# Altium footprint library My Footprint.PcbLib: 268 footprints (part 3 of 17)
Each footprint in its own frame and in the unit in brackets; x right, y up, seen from the top. Pads: shape width x height; smd on the part's side, far side on the other; paste and mask are expansions set on the pad; w line width, h text height; cw(c..) or ccw(c..) is an arc to the next point about the centre after c.
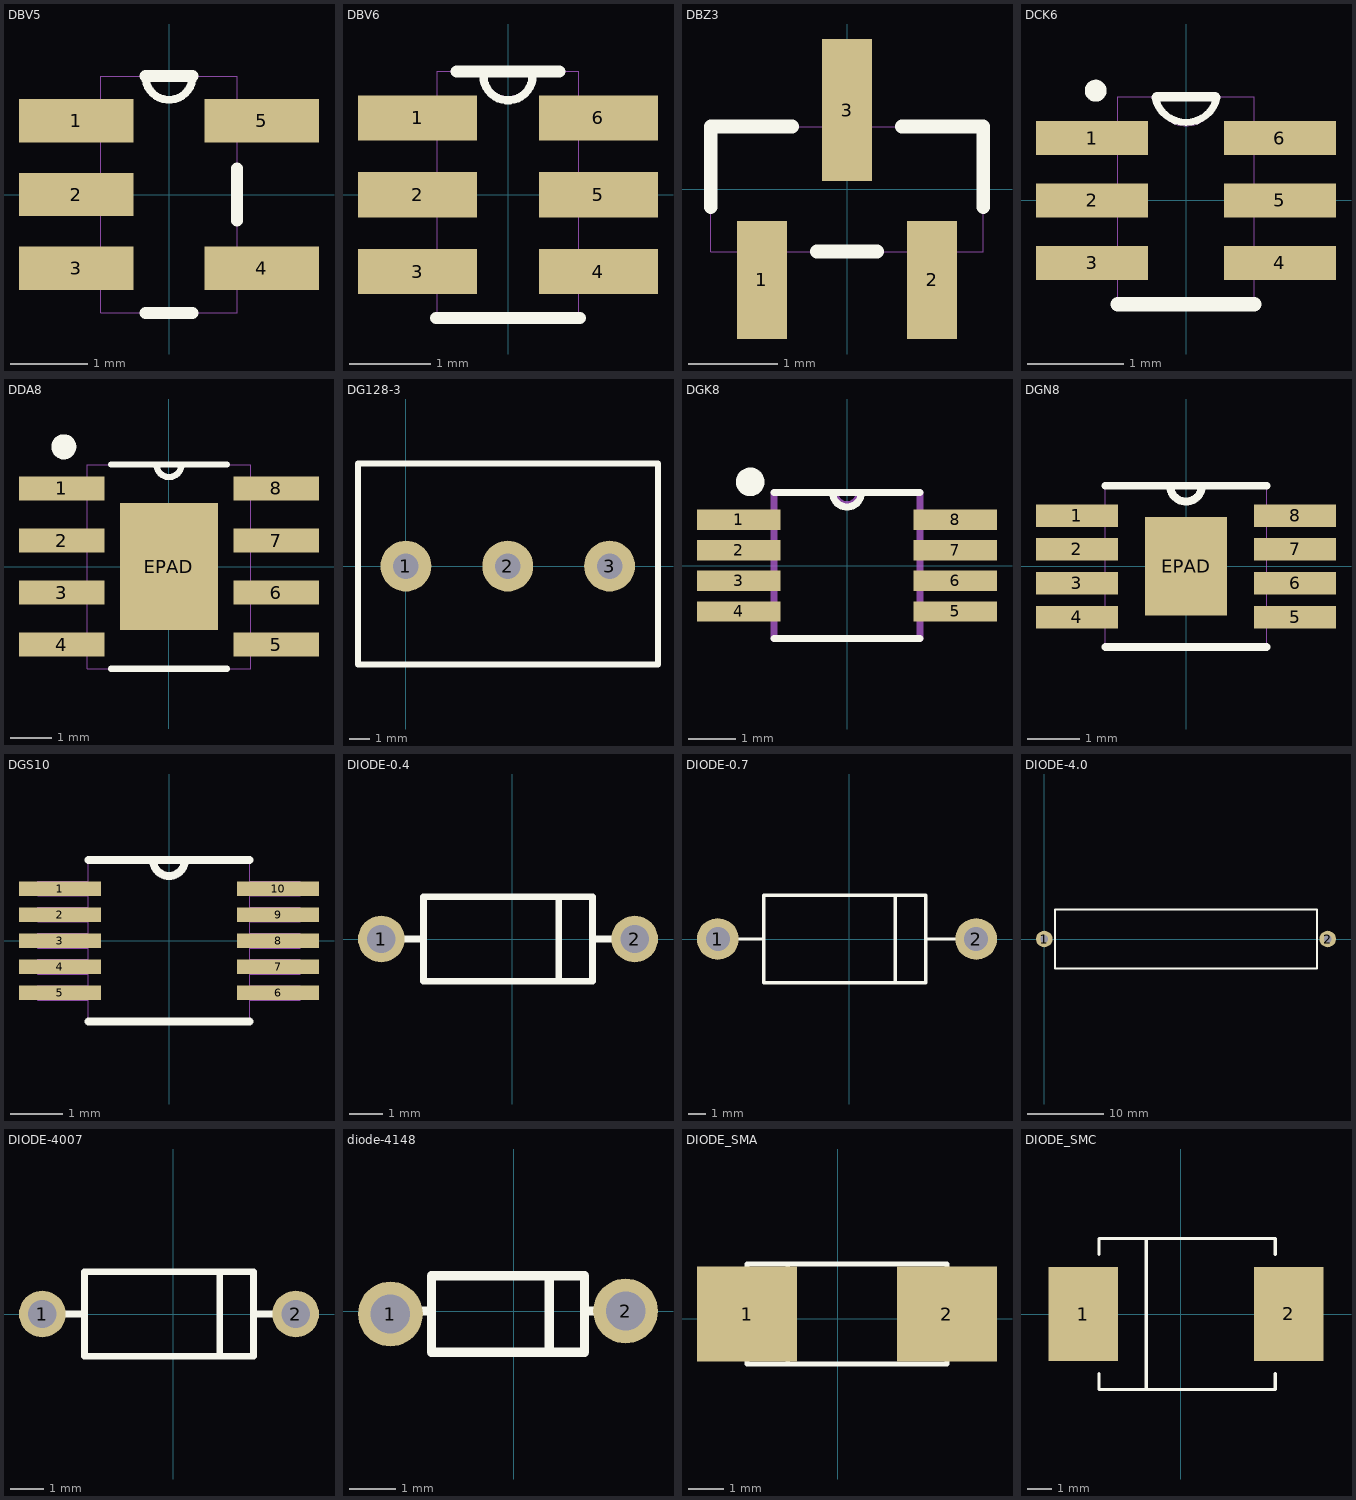
[diagram p2: the footprints below, top view; thin cyan lines are the x and y axes]

## DBV5 [mil]
pads (5):
  rect 58x22 smd: 1(-47,37.4) 2(-47,0) 3(-47,-37.4) 4(47,-37.4) 5(47,37.4)
Top Overlay:
  lines w4: -12,60 ccw(c0,60) 12,60
  lines w6: -11.91,-60 11.91,-60 ; -11.91,60 11.91,60 ; 34.5,-13.3 34.5,13.3
Mechanical 1:
  lines w0: -12,60 ccw(c0,60) 12,60 ; -59,-47.4 -34.5,-47.4 -34.5,-27.4 -59,-27.4 -59,-47.4 ; -59,-10 -34.5,-10 -34.5,10 -59,10 -59,-10 ; -59,27.4 -34.5,27.4 -34.5,47.4 -59,47.4 -59,27.4 ; -34.5,-60 -34.5,60 34.5,60 34.5,-60 -34.5,-60 ; 34.5,-47.4 59,-47.4 59,-27.4 34.5,-27.4 34.5,-47.4 ; 34.5,27.4 59,27.4 59,47.4 34.5,47.4 34.5,27.4
3D body "DBV0005A（sot830?": height 46, standoff 3, extent -56,-57.51 56,57.49

## DBV6 [mil]
pads (6):
  rect 58x22 smd: 1(-44,37.4) 2(-44,0) 3(-44,-37.4) 4(44,-37.4) 5(44,0) 6(44,37.4)
Top Overlay:
  lines w4: -12,58 ccw(c0,58) 12,58
  lines w6: -35,-60 35,-60 ; -25,60 25,60
Mechanical 1:
  lines w0: -12,60 ccw(c0,60) 12,60 ; -59,-47.4 -34.5,-47.4 -34.5,-27.4 -59,-27.4 -59,-47.4 ; -59,-10 -34.5,-10 -34.5,10 -59,10 -59,-10 ; -59,27.4 -34.5,27.4 -34.5,47.4 -59,47.4 -59,27.4 ; -34.5,-60 -34.5,60 34.5,60 34.5,-60 -34.5,-60 ; 34.5,-47.4 59,-47.4 59,-27.4 34.5,-27.4 34.5,-47.4 ; 34.5,-10 59,-10 59,10 34.5,10 34.5,-10 ; 34.5,27.4 59,27.4 59,47.4 34.5,47.4 34.5,27.4
3D body "DBV0006A.stp": height 43, standoff -1, extent -55,-55.49 57,59.51

## DBZ3 [mil]
pads (3):
  rect 22x52 smd: 1(-37.4,-40) 2(37.4,-40)
  rect 22x62.5 smd: 3(0,34.75)
Top Overlay:
  lines w6: -60,-7.91 -60,27.5 -24.1,27.5 ; -13.3,-27.5 13.3,-27.5 ; 24.1,27.5 60,27.5 60,-7.91
Mechanical 1:
  lines w0: -60,-27.5 60,-27.5 60,27.5 -60,27.5 -60,-27.5 ; -47.4,-52 -47.4,-27.5 -27.4,-27.5 -27.4,-52 -47.4,-52 ; -10,27.5 10,27.5 10,52 -10,52 -10,27.5 ; 27.4,-52 27.4,-27.5 47.4,-27.5 47.4,-52 27.4,-52
3D body "DBZ0003A（SOT23?": height 47.5, standoff 9, extent -57.49,-49.5 57.51,49.51

## DCK6 [mil]
pads (6):
  rect 46x14 smd: 1(-38.5,25.59) 2(-38.5,0) 3(-38.5,-25.59) 4(38.5,-25.59) 5(38.5,0) 6(38.5,25.59)
Top Overlay:
  circle w5: c-37,45 r2
  lines w3: -12.73,42.35 ccw(c0,45) 12.73,42.35
  lines w4: -12,42.5 12,42.5
  lines w6: -28,-42.5 28,-42.5
Mechanical 1:
  lines w0: -12,42.5 ccw(c0,42.5) 12,42.5 ; -47.5,-31.59 -47.5,-19.59 -28,-19.59 -28,-31.59 -47.5,-31.59 ; -47.5,-6 -47.5,6 -28,6 -28,-6 -47.5,-6 ; -47.5,19.59 -47.5,31.59 -28,31.59 -28,19.59 -47.5,19.59 ; -28,-42.5 28,-42.5 28,42.5 -28,42.5 -28,-42.5 ; 28,-31.59 28,-19.59 47.5,-19.59 47.5,-31.59 28,-31.59 ; 28,-6 28,6 47.5,6 47.5,-6 28,-6 ; 28,19.59 28,31.59 47.5,31.59 47.5,19.59 28,19.59
3D body "DCK0006A（7311?": height 35.98, standoff -1.42, extent -44.88,-39.36 44.88,39.38

## DDA8 [mil]
pads (9):
  rect 82x23 smd: 1(-103,75) 2(-103,25) 3(-103,-25) 4(-103,-75) 5(103,-75) 6(103,-25) 7(103,25) 8(103,75)
  rect 94.49x122.05 smd paste-60.52: EPAD(0,0)
Top Overlay:
  circle w12: c-101,115 r6
  lines w6: -55.73,-98 55.73,-98 ; -55.73,98 55.73,98 ; -12,98 ccw(c0,98) 12,98
Top Paste:
  region: 43.31,57.09 -43.31,57.09 -43.31,3.94 43.31,3.94
  region: 43.31,-3.94 -43.31,-3.94 -43.31,-57.09 43.31,-57.09
Mechanical 1:
  lines w0: -12,98 ccw(c0,98) 12,98 ; -122,-84.5 -122,-65.5 -78.5,-65.5 -78.5,-84.5 -122,-84.5 ; -122,-34.5 -122,-15.5 -78.5,-15.5 -78.5,-34.5 -122,-34.5 ; -122,15.5 -122,34.5 -78.5,34.5 -78.5,15.5 -122,15.5 ; -122,65.5 -122,84.5 -78.5,84.5 -78.5,65.5 -122,65.5 ; -78.5,-98 78.5,-98 78.5,98 -78.5,98 -78.5,-98 ; 78.5,-84.5 78.5,-65.5 122,-65.5 122,-84.5 78.5,-84.5 ; 78.5,-34.5 78.5,-15.5 122,-15.5 122,-34.5 78.5,-34.5 ; 78.5,15.5 78.5,34.5 122,34.5 122,15.5 78.5,15.5 ; 78.5,65.5 78.5,84.5 122,84.5 122,65.5 78.5,65.5
3D body "DDA0008A.stp": height 60, standoff -1, extent -117.25,-96.5 117.25,96.5

## DG128-3 [mil]
pads (3):
  round 100 hole 50: 1(0,0) 2(200,0) 3(400,0)
Top Overlay:
  lines w12: -94,-193 -94,201 495,201 495,-193 -94,-193
3D body "DG128-5.0-3P.STEP": height 551.18, standoff -168.51, extent -100,-192.92 519.69,200.78

## DGK8 [mil]
height 43
pads (8):
  rect 70x17 smd: 1(-90.5,38.39) 2(-90.5,12.8) 3(-90.5,-12.8) 4(-90.5,-38.39) 5(90.5,-38.39) 6(90.5,-12.8) 7(90.5,12.8) 8(90.5,38.39)
Top Overlay:
  circle w12: c-81,70 r6
  lines w6: -61,-61 61,-61 ; -61,61 61,61 ; -12,61 ccw(c0,61) 12,61
Mechanical 1:
  lines w0: -12,61 ccw(c0,61) 12,61 ; -104.5,-45.89 -66,-45.89 -66,-30.89 -104.5,-30.89 -104.5,-45.89 ; -104.5,-20.3 -66,-20.3 -66,-5.3 -104.5,-5.3 -104.5,-20.3 ; -104.5,5.3 -66,5.3 -66,20.3 -104.5,20.3 -104.5,5.3 ; -104.5,30.89 -66,30.89 -66,45.89 -104.5,45.89 -104.5,30.89 ; -61,-61 -61,61 61,61 61,-61 -61,-61 ; 66,-45.89 104.5,-45.89 104.5,-30.89 66,-30.89 66,-45.89 ; 66,-20.3 104.5,-20.3 104.5,-5.3 66,-5.3 66,-20.3 ; 66,5.3 104.5,5.3 104.5,20.3 66,20.3 66,5.3 ; 66,30.89 104.5,30.89 104.5,45.89 66,45.89 66,30.89
  lines w6: -10.17,61 ccw(c0,61) 10.17,61 ; -61,-61 61,-61 61,61 -61,61 -61,-61
  text "43" at 0,0 h50
3D body "DGK0008A.stp": height 37.5, standoff -0.5, extent -96.49,-59 96.5,59

## DGN8 [mil]
pads (9):
  rect 62x17 smd: 1(-82.5,38.39) 2(-82.5,12.8) 3(-82.5,-12.8) 4(-82.5,-38.39) 5(82.5,-38.39) 6(82.5,-12.8) 7(82.5,12.8) 8(82.5,38.39)
  rect 61.81x74.41 smd paste-36.7: EPAD(0,0)
Top Overlay:
  lines w6: -61,-61 61,-61 ; -61,61 61,61 ; -12,61 ccw(c0,61) 4.97,50.08 ; 5.44,50.3 ccw(c0,61) 12,61
Top Paste:
  region: 30.91,37.2 -30.91,37.2 -30.91,-37.2 30.91,-37.2
Mechanical 1:
  lines w0: -12,61 ccw(c0,61) 12,61 ; -99.5,-45.89 -61,-45.89 -61,-30.89 -99.5,-30.89 -99.5,-45.89 ; -99.5,-20.3 -61,-20.3 -61,-5.3 -99.5,-5.3 -99.5,-20.3 ; -99.5,5.3 -61,5.3 -61,20.3 -99.5,20.3 -99.5,5.3 ; -99.5,30.89 -61,30.89 -61,45.89 -99.5,45.89 -99.5,30.89 ; -61,-61 -61,61 61,61 61,-61 -61,-61 ; 61,-45.89 99.5,-45.89 99.5,-30.89 61,-30.89 61,-45.89 ; 61,-20.3 99.5,-20.3 99.5,-5.3 61,-5.3 61,-20.3 ; 61,5.3 99.5,5.3 99.5,20.3 61,20.3 61,5.3 ; 61,30.89 99.5,30.89 99.5,45.89 61,45.89 61,30.89
3D body "DGN0008A（2005?": height 38.5, standoff 0.5, extent -96.5,-60 96.5,58

## DGS10 [mil]
pads (10):
  rect 62x11 smd: 1(-82.5,39.37) 2(-82.5,19.68) 3(-82.5,0) 4(-82.5,-19.68) 5(-82.5,-39.37) 6(82.5,-39.37) 7(82.5,-19.68) 8(82.5,0) 9(82.5,19.68) 10(82.5,39.37)
Top Overlay:
  lines w6: -61,-61 61,-61 ; -61,61 61,61 ; -12,61 ccw(c0,61) 12,61
Mechanical 1:
  lines w0: -12,61 ccw(c0,61) 12,61 ; -99.5,-44.87 -99.5,-33.87 -61,-33.87 -61,-44.87 -99.5,-44.87 ; -99.5,-25.18 -99.5,-14.19 -61,-14.19 -61,-25.18 -99.5,-25.18 ; -99.5,-5.5 -99.5,5.5 -61,5.5 -61,-5.5 -99.5,-5.5 ; -99.5,14.19 -99.5,25.18 -61,25.18 -61,14.19 -99.5,14.19 ; -99.5,33.87 -99.5,44.87 -61,44.87 -61,33.87 -99.5,33.87 ; -61,-61 61,-61 61,61 -61,61 -61,-61 ; 61,-44.87 61,-33.87 99.5,-33.87 99.5,-44.87 61,-44.87 ; 61,-25.18 61,-14.19 99.5,-14.19 99.5,-25.18 61,-25.18 ; 61,-5.5 61,5.5 99.5,5.5 99.5,-5.5 61,-5.5 ; 61,14.19 61,25.18 99.5,25.18 99.5,14.19 61,14.19 ; 61,33.87 61,44.87 99.5,44.87 99.5,33.87 61,33.87
3D body "DGS0010A.stp": height 38.5, standoff 0.5, extent -96.5,-59.01 96.5,58.99

## DIODE-0.4 [mm] "1N4007"
height 2.54
pads (2):
  round 1.4 hole 0.85: 1(-3.937,0) 2(3.683,0)
Top Overlay:
  lines w0.2: -3.429,0 -2.667,0 ; 1.397,-1.27 1.397,1.27 ; 2.413,0 3.175,0 ; -2.667,-1.27 2.413,-1.27 2.413,1.27 -2.667,1.27 -2.667,-1.27
3D body "SW3dPS-1N4007.STEP": height 2.68, standoff -1.65, extent -4.331,-1.333 4.077,1.334

## DIODE-0.7 [mil] "5822,5819,5408"
height 200
pads (2):
  round 95 hole 55: 1(-300,0) 2(290,0)
Top Overlay:
  lines w7.87: -275,0 -200,0 ; 105,-100 105,100 ; 180,0 255,0 ; -195,-100 175,-100 175,100 -195,100 -195,-100
3D body "SW3dPS-BYW98.STEP": height 214.33, standoff -126.22, extent -325.86,-104.32 315.88,104.34

## DIODE-4.0 [mil]
pads (2):
  round 85 hole 40: 1(0,0) 2(1450,0)
Top Overlay:
  lines w10: 55,-150 1395,-150 1395,150 55,150 55,-150
3D body: height 290, standoff 0, extent 50,-150 1395,150

## DIODE-4007 [mm] "1N4007"
height 2.54
pads (2):
  round 1.4 hole 0.85: 1(-3.937,0) 2(3.683,0)
Top Overlay:
  lines w0.2: -3.429,0 -2.667,0 ; 1.397,-1.27 1.397,1.27 ; 2.413,0 3.175,0 ; -2.667,-1.27 -2.667,1.27 2.413,1.27 2.413,-1.27 -2.667,-1.27
3D body "SW3dPS-1N4007.STEP": height 2.68, standoff -1.65, extent -4.331,-1.333 4.077,1.334

## diode-4148 [mm] "1N4148"
height 2.54
pads (2):
  round 1.4 hole 0.85: 1(-2.667,-0.064) 2(2.413,0)
Top Overlay:
  lines w0.2: -2.54,0 -1.778,0 ; 0.762,-0.889 0.762,0.762 ; 1.524,0 2.286,0 ; -1.778,-0.889 1.524,-0.889 1.524,0.762 -1.778,0.762 -1.778,-0.889
3D body "SW3dPS-1N4148.STEP": height 2.83, standoff 0, extent -2.883,-0.889 2.629,0.761

## DIODE_SMA [mil] "Magnetic-Core Inductor with Winding Polarity Marking; 2 Leads"
pads (2):
  rect 110x105 smd: 1(-100,5) 2(120,5)
Top Overlay:
  lines w5: -100,-30 -100,-50 120,-50 120,-35 ; -100,45 -100,60 120,60 120,45 ; -55,-50 -55,60
3D body "SW3dPS-DO-214AC SMA.STEP": height 94.57, standoff -0.12, extent -92.36,-46.18 112.36,56.18

## DIODE_SMC [mil] "Magnetic-Core Inductor with Winding Polarity Marking; 2 Leads"
pads (2):
  rect 110x150 smd: 1(-155,0) 2(171.49,0.01)
Top Overlay:
  lines w5: -130,-95 -130,-120 150,-120 150,-95 ; -130,95 -130,120 150,120 150,95 ; -55,-120 -55,120
Mechanical 1:
  lines w1: -130,-120 150,-120 ; -130,120 150,120
3D body "SW3dPS-DO-214AB SMC.STEP": height 91.57, standoff 0.82, extent -146.5,-116.14 166.49,116.15